# Altium footprint library PCB_TechDemo.PcbLib: 44 footprints (part 3 of 3)
Each footprint in its own frame and in the unit in brackets; x right, y up, seen from the top. Pads: shape width x height; smd on the part's side, far side on the other; paste and mask are expansions set on the pad; w line width, h text height; cw(c..) or ccw(c..) is an arc to the next point about the centre after c.
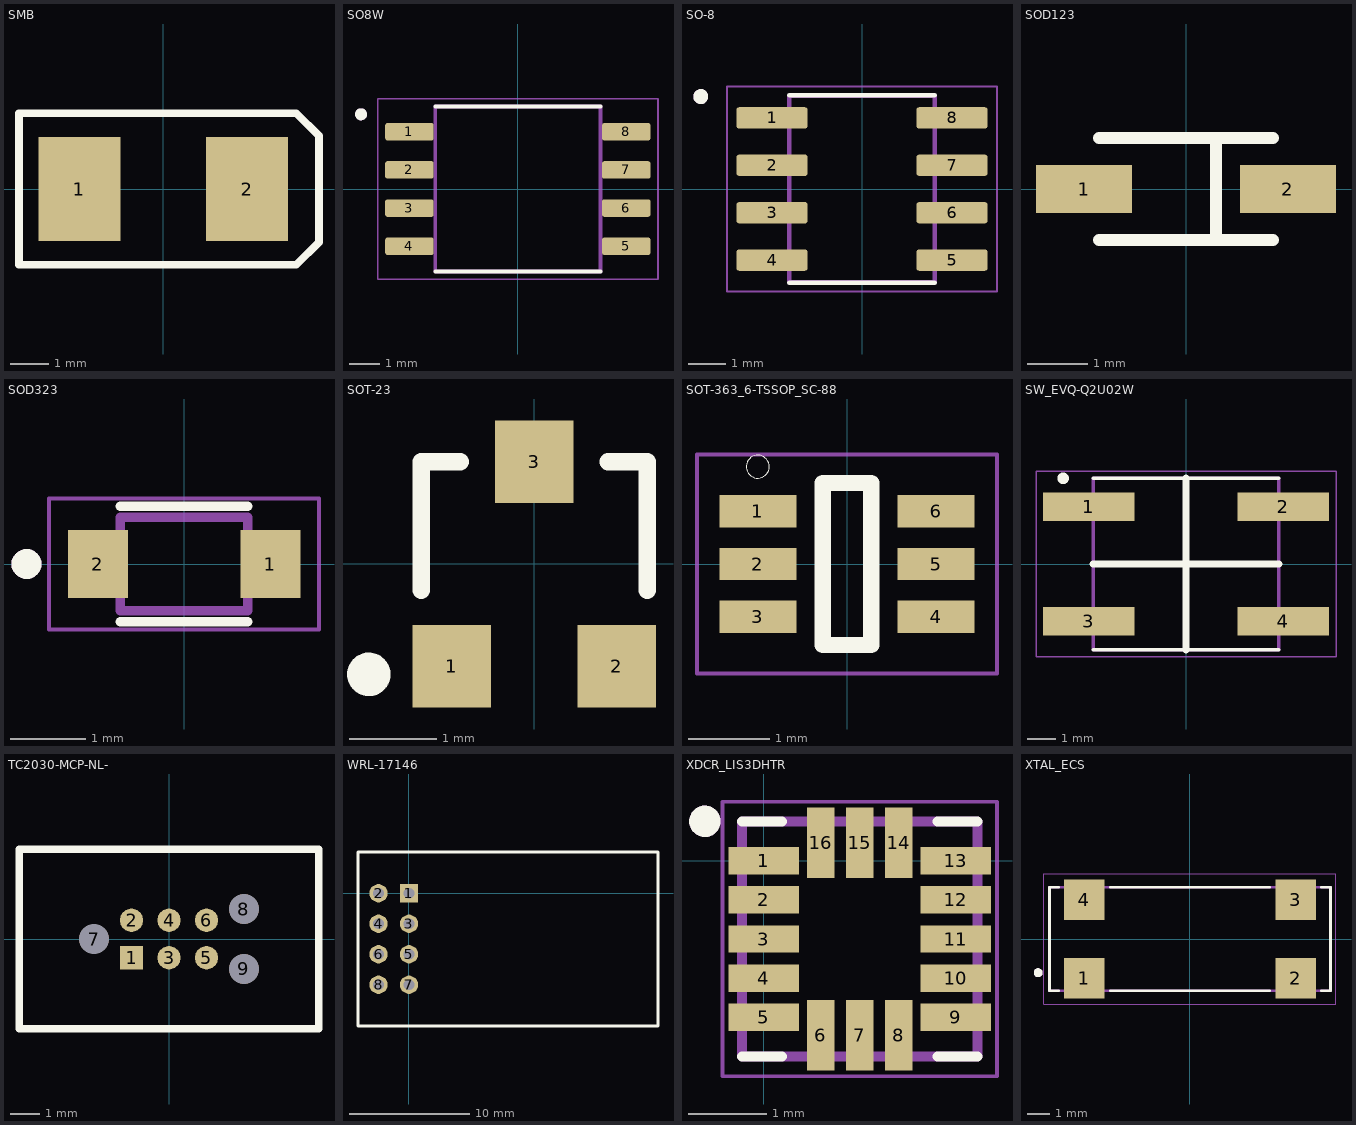
[diagram p2: the footprints below, top view; thin cyan lines are the x and y axes]

## SMB [mm] "DIODE SCHOTTKY 40V 1A SMB"
height 1.95
pads (2):
  rect 2.159x2.743 smd: 1(-2.21,0) 2(2.21,0)
Top Overlay:
  lines w0.2: -3.8,-2 -3.8,2 3.5,2 4.1,1.4 4.1,-1.4 3.5,-2 -3.8,-2
3D body: height 2.44, standoff -0.01, extent -2.795,-1.84 2.795,2.1

## SO8W [mm] "8 Pin SOP2 (SO8W) 5mm x 5mm"
height 1.91
pads (8):
  rrect25% 1.61x0.58 smd: 1(-3.605,1.905) 2(-3.605,0.635) 3(-3.605,-0.635) 4(-3.605,-1.905) 5(3.605,-1.905) 6(3.605,-0.635) 7(3.605,0.635) 8(3.605,1.905)
Top Overlay:
  circle w0.2: c-5.215,2.485 r0.1
  lines w0.127: -2.745,-2.745 2.745,-2.745 ; -2.745,2.745 2.745,2.745
Mechanical 13:
  circle w0.2: c-5.215,2.485 r0.1
  lines w0.127: -2.745,-2.745 2.745,-2.745 2.745,2.745 -2.745,2.745 -2.745,-2.745
Mechanical 15:
  lines w0.05: -4.66,-2.995 4.66,-2.995 4.66,2.995 -4.66,2.995 -4.66,-2.995
3D body: height 1.75, standoff -0.01, extent -4.051,-2.73 4.05,2.73

## SO-8 [mm] "SO8 IC"
height 1.45
pads (8):
  rrect25% 1.91x0.57 smd: 1(-2.41,1.905) 2(-2.41,0.635) 3(-2.41,-0.635) 4(-2.41,-1.905) 5(2.41,-1.905) 6(2.41,-0.635) 7(2.41,0.635) 8(2.41,1.905)
Top Overlay:
  circle w0.2: c-4.32,2.475 r0.1
  lines w0.127: -1.95,-2.51 1.95,-2.51 ; -1.95,2.51 1.95,2.51
Mechanical 13:
  circle w0.2: c-4.32,2.475 r0.1
  lines w0.127: -1.95,-2.5 1.95,-2.5 1.95,2.5 -1.95,2.5 -1.95,-2.5
Mechanical 15:
  lines w0.05: -3.615,-2.75 3.615,-2.75 3.615,2.75 -3.615,2.75 -3.615,-2.75
3D body: height 1.75, standoff -0.01, extent -3.1,-2.5 3.1,2.5

## SOD123 [mm] "SOD123"
height 1.35
pads (2):
  rect 1.6x0.8 smd: 1(-1.7,0) 2(1.7,0)
Top Overlay:
  lines w0.2: -1.45,-0.85 1.45,-0.85 ; -1.45,0.85 1.45,0.85 ; 0.5,-0.85 0.5,0.85
3D body: height 1.27, standoff 0, extent -1.85,-0.8 1.85,0.8

## SOD323 [mm] "SOD323"
height 1.15
pads (2):
  rect 0.8x0.9 smd: 1(1.15,0) 2(-1.15,0)
Top Overlay:
  circle w0.2: c-2.1,0 r0.1
  lines w0.127: -0.85,-0.77 0.85,-0.77 ; -0.85,0.77 0.85,0.77
Mechanical 13:
  circle w0.2: c-2.1,0 r0.1
  lines w0.127: -0.85,-0.625 -0.85,0.625 0.85,0.625 0.85,-0.625 -0.85,-0.625
Mechanical 15:
  lines w0.05: -1.8,-0.875 1.8,-0.875 1.8,0.875 -1.8,0.875 -1.8,-0.875
3D body: height 1.1, standoff 0, extent -1.3,-0.675 1.3,0.675

## SOT-23 [mm] "SOT23-3"
height 1.1
pads (3):
  rect 0.9x0.95 smd: 1(-0.95,-1.175) 2(0.95,-1.175) 3(0,1.175)
Top Overlay:
  circle w0.25: c-1.903,-1.27 r0.125
  lines w0.2: -1.3,-0.3 -1.3,1.175 -0.85,1.175 ; 0.85,1.175 1.3,1.175 1.3,-0.3
3D body: height 1.1, standoff 0, extent -1.4,-1.15 1.6,1.35

## SOT-363_6-TSSOP_SC-88 [mm] "COMMON NAMES: SOT-363, 6-TSSOP, SC-88"
height 1.2
pads (6):
  rect 0.95x0.4 smd: 1(-1.1,0.65) 2(-1.1,0) 3(-1.1,-0.65) 4(1.1,-0.65) 5(1.1,0) 6(1.1,0.65)
Top Overlay:
  circle w0: c-1.1,1.2 r0.141
  lines w0.2: -0.3,-1 0.3,-1 0.3,1 -0.3,1 -0.3,-1
Mechanical 15:
  lines w0.05: -1.85,-1.35 1.85,-1.35 1.85,1.35 -1.85,1.35 -1.85,-1.35
3D body: height 1.1, standoff 0, extent -1.2,-1.1 1.2,1.1

## SW_EVQ-Q2U02W [mm] "SWITCH"
height 2.25
pads (4):
  rect 3.2x1 smd: 1(-3.4,2) 2(3.4,2) 3(-3.4,-2) 4(3.4,-2)
Top Overlay:
  circle w0.2: c-4.3,3 r0.1
  lines w0.127: -3.25,-3 3.25,-3 ; -3.25,3 3.25,3
  lines w0.254: -3.25,0 3.25,0 ; 0,-3 0,3
Mechanical 13:
  lines w0.127: -3.25,-3 3.25,-3 3.25,3 -3.25,3 -3.25,-3
Mechanical 15:
  lines w0.05: -5.25,-3.25 5.25,-3.25 5.25,3.25 -5.25,3.25 -5.25,-3.25
3D body: height 1.8, standoff 0, extent -3.25,-3 3.25,3
3D body: height 2.3, standoff 1.8, extent -1.9,-1.897 1.9,1.897

## TC2030-MCP-NL- [mm] "CABLE TAG-CONNECT IN-CIRCUIT"
pads (9):
  rect 0.787x0.787 smd: 1(-1.27,-0.635)
  round 0.787 smd: 2(-1.27,0.635) 3(0,-0.635) 4(0,0.635) 5(1.27,-0.635) 6(1.27,0.635)
  oval 1x0.991 hole 1 unplated: 7(-2.54,0)
  round 1 hole 1 unplated: 8(2.54,1.016) 9(2.54,-1.016)
Top Overlay:
  lines w0.254: -5.08,-3.048 -5.08,3.048 5.08,3.048 5.08,-3.048 -5.08,-3.048

## WRL-17146 [mil] "ESP8266 WIFI MODULE"
height 78.74
pads (8):
  rect 60x60 hole 35: 1(0,0)
  round 60 hole 35: 2(-100,0) 3(0,-100) 4(-100,-100) 5(0,-200) 6(-100,-200) 7(0,-300) 8(-100,-300)
Top Overlay:
  lines w10: -167.32,-435.43 816.93,-435.43 816.93,135.43 -167.32,135.43 -167.32,-435.43
3D body: height 231.4, standoff -228.35, extent -165.35,-433.07 811.02,137.8

## XDCR_LIS3DHTR [mm]
pads (16):
  rect 0.9x0.35 smd paste-1 mask+0: 1(0,0) 2(0,-0.5) 3(0,-1) 4(0,-1.5) 5(0,-2) 9(2.45,-2) 10(2.45,-1.5) 11(2.45,-1) 12(2.45,-0.5) 13(2.45,0)
  rect 0.35x0.9 smd paste-1 mask+0: 6(0.725,-2.225) 7(1.225,-2.225) 8(1.725,-2.225) 14(1.725,0.225) 15(1.225,0.225) 16(0.725,0.225)
Top Overlay:
  circle w0.2: c-0.75,0.5 r0.1
  lines w0.127: -0.275,-2.5 0.235,-2.5 ; -0.275,0.5 0.235,0.5 ; 2.215,-2.5 2.725,-2.5 ; 2.215,0.5 2.725,0.5
Top Paste:
  region: 2.63,-0.14 2.27,-0.14 2.27,0.14 2.63,0.14
  region: 2.63,-0.64 2.27,-0.64 2.27,-0.36 2.63,-0.36
  region: 2.63,-1.14 2.27,-1.14 2.27,-0.86 2.63,-0.86
  region: 1.405,0.085 1.045,0.085 1.045,0.365 1.405,0.365
  region: 1.905,0.085 1.545,0.085 1.545,0.365 1.905,0.365
  region: 2.63,-1.64 2.27,-1.64 2.27,-1.36 2.63,-1.36
  region: 2.63,-2.14 2.27,-2.14 2.27,-1.86 2.63,-1.86
  region: 1.905,-2.365 1.545,-2.365 1.545,-2.085 1.905,-2.085
  region: 1.405,-2.365 1.045,-2.365 1.045,-2.085 1.405,-2.085
  region: 0.905,0.085 0.545,0.085 0.545,0.365 0.905,0.365
  region: 0.18,-0.14 -0.18,-0.14 -0.18,0.14 0.18,0.14
  region: 0.18,-0.64 -0.18,-0.64 -0.18,-0.36 0.18,-0.36
  region: 0.18,-1.14 -0.18,-1.14 -0.18,-0.86 0.18,-0.86
  region: 0.905,-2.365 0.545,-2.365 0.545,-2.085 0.905,-2.085
  region: 0.18,-1.64 -0.18,-1.64 -0.18,-1.36 0.18,-1.36
  region: 0.18,-2.14 -0.18,-2.14 -0.18,-1.86 0.18,-1.86
Top Solder:
  region: 2.725,-0.225 2.175,-0.225 2.175,0.225 2.725,0.225
  region: 2.725,-0.725 2.175,-0.725 2.175,-0.275 2.725,-0.275
  region: 2.725,-1.225 2.175,-1.225 2.175,-0.775 2.725,-0.775
  region: 2,0 1.45,0 1.45,0.45 2,0.45
  region: 1.5,0 0.95,0 0.95,0.45 1.5,0.45
  region: 2.725,-1.725 2.175,-1.725 2.175,-1.275 2.725,-1.275
  region: 2.725,-2.225 2.175,-2.225 2.175,-1.775 2.725,-1.775
  region: 1.5,-2.45 0.95,-2.45 0.95,-2 1.5,-2
  region: 2,-2.45 1.45,-2.45 1.45,-2 2,-2
  region: 1,0 0.45,0 0.45,0.45 1,0.45
  region: 0.275,-0.225 -0.275,-0.225 -0.275,0.225 0.275,0.225
  region: 0.275,-0.725 -0.275,-0.725 -0.275,-0.275 0.275,-0.275
  region: 1,-2.45 0.45,-2.45 0.45,-2 1,-2
  region: 0.275,-1.225 -0.275,-1.225 -0.275,-0.775 0.275,-0.775
  region: 0.275,-1.725 -0.275,-1.725 -0.275,-1.275 0.275,-1.275
  region: 0.275,-2.225 -0.275,-2.225 -0.275,-1.775 0.275,-1.775
Mechanical 13:
  circle w0.2: c-0.75,0.5 r0.1
  lines w0.127: -0.275,-2.5 2.725,-2.5 2.725,0.5 -0.275,0.5 -0.275,-2.5
Mechanical 15:
  lines w0.05: -0.525,-2.75 2.975,-2.75 2.975,0.75 -0.525,0.75 -0.525,-2.75
3D body: height 1.01, standoff 1, extent 0.038,-0.098 0.436,0.302
3D body: height 1, standoff 0, extent -0.275,-2.5 2.725,0.5

## XTAL_ECS [mm] "CRYSTAL ECS SERIES"
height 0.094
pads (4):
  rect 1.8x1.8 smd: 1(-4.7,-1.75) 2(4.7,-1.75) 3(4.7,1.75) 4(-4.7,1.75)
Top Overlay:
  circle w0.2: c-6.75,-1.5 r0.1
  lines w0.127: -5.854,-2.3 -6.25,-2.3 -6.25,2.3 -5.854,2.3 ; -3.546,-2.3 3.546,-2.3 ; -3.546,2.3 3.546,2.3 ; 5.854,-2.3 6.25,-2.3 6.25,2.3 5.854,2.3
Mechanical 13:
  circle w0.2: c-6.75,-1.5 r0.1
  lines w0.127: -6.25,-2.3 6.25,-2.3 6.25,2.3 -6.25,2.3 -6.25,-2.3
Mechanical 15:
  lines w0.05: -6.5,-2.9 6.5,-2.9 6.5,2.9 -6.5,2.9 -6.5,-2.9
3D body: height 3.7, standoff 0, extent -6.25,-2.3 6.25,2.3